# Altium schematic symbol library jlcpcb_2025_04_capacitors_extended_1206.schlib: 2503 symbols (part 4 of 14)
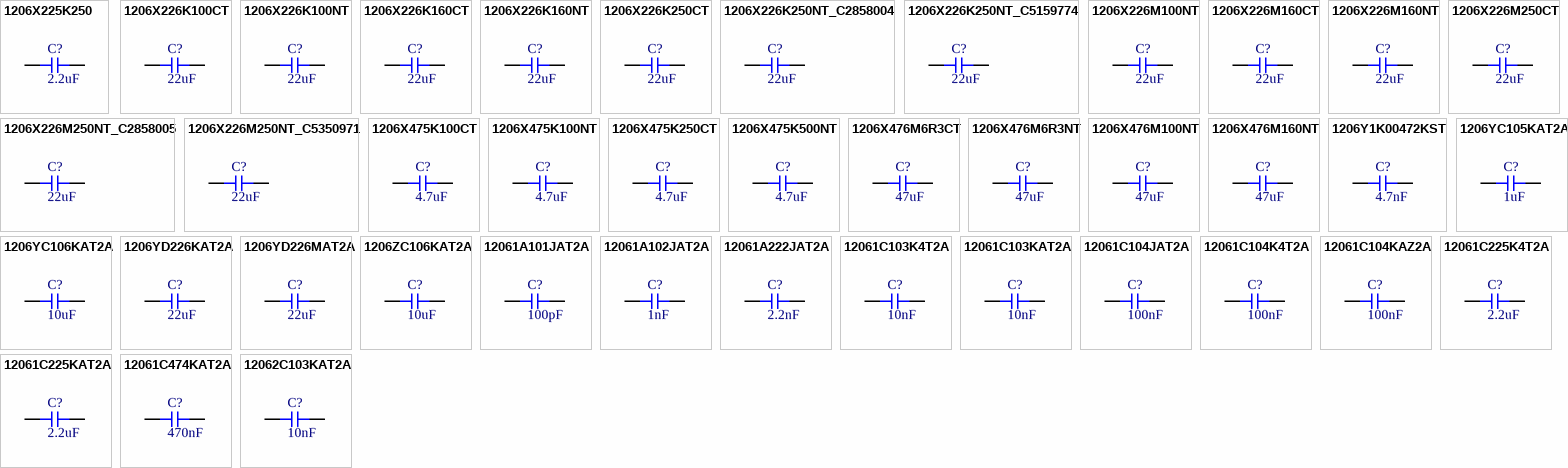
[diagram p65: symbols 1206X225K250 to 12062C103KAT2A]

## 1206X476M6R3CT
designator C?  Capacitance: 47uF  (hidden comment: *)
Capacitor, Ceramic (MLCC), 47uF, ±20%, 6.3V, X5R, ±20%, SMD 1206; Manufacturer: Walsin Tech Corp; Manufacturer Part Number: 1206X476M6R3CT; Package Size: 1206; JLCPCB Basic Part: No; JLCPCB Part Number: C396796; Supplier 1: LCSC; Category: Capacitors - MLCC; Supplier Part Number 1: C396796; Tolerance: ±20%; Voltage Rating: 6.3V; Temperature Coefficient: X5R; RoHS: Yes; ComponentLink1Description: Datasheet; ComponentLink1URL: https://wmsc.lcsc.com/wmsc/upload/file/pdf/v2/lcsc/2304140030_Walsin-Tech-Corp-1206X476M6R3CT_C396796.pdf; ComponentLink2Description: JLCPCB Part URL; ComponentLink2URL: https://jlcpcb.com/partdetail/C396796; ComponentLink3Description: LCSC Part URL; ComponentLink3URL: https://lcsc.com/product-detail/Multilayer-Ceramic-Capacitors-MLCC---SMD-SMT_Walsin-Tech-Corp-Walsin-Tech-Corp-1206X476M6R3CT_C396796.html
footprint CAP-1206 (1206 (3216M) Capacitor)
pins: 1, 2

## 1206X476M6R3NT
designator C?  Capacitance: 47uF  (hidden comment: *)
Capacitor, Ceramic (MLCC), 47uF, ±20%, 6.3V, X5R, ±20%, SMD 1206; Manufacturer: FH(Guangdong Fenghua Advanced Tech); Manufacturer Part Number: 1206X476M6R3NT; Package Size: 1206; JLCPCB Basic Part: No; JLCPCB Part Number: C105473; Supplier 1: LCSC; Category: Capacitors - MLCC; Supplier Part Number 1: C105473; Tolerance: ±20%; Voltage Rating: 6.3V; Temperature Coefficient: X5R; RoHS: Yes; ComponentLink1Description: Datasheet; ComponentLink1URL: https://wmsc.lcsc.com/wmsc/upload/file/pdf/v2/lcsc/2304140030_FH--Guangdong-Fenghua-Advanced-Tech-1206X476M6R3NT_C105473.pdf; ComponentLink2Description: JLCPCB Part URL; ComponentLink2URL: https://jlcpcb.com/partdetail/C105473; ComponentLink3Description: LCSC Part URL; ComponentLink3URL: https://lcsc.com/product-detail/Multilayer-Ceramic-Capacitors-MLCC---SMD-SMT_FH-Guangdong-Fenghua-Advanced-Tech-FH-Guangdong-Fenghua-Advanced-Tech-1206X476M6R3NT_C105473.html
footprint CAP-1206 (1206 (3216M) Capacitor)
pins: 1, 2

## 1206X476M100NT
designator C?  Capacitance: 47uF  (hidden comment: *)
Capacitor, Ceramic (MLCC), 47uF, ±20%, 10V, X5R, ±20%, SMD 1206; Manufacturer: FH(Guangdong Fenghua Advanced Tech); Manufacturer Part Number: 1206X476M100NT; Package Size: 1206; JLCPCB Basic Part: No; JLCPCB Part Number: C96381; Supplier 1: LCSC; Category: Capacitors - MLCC; Supplier Part Number 1: C96381; Tolerance: ±20%; Voltage Rating: 10V; Temperature Coefficient: X5R; RoHS: Yes; ComponentLink1Description: Datasheet; ComponentLink1URL: https://wmsc.lcsc.com/wmsc/upload/file/pdf/v2/lcsc/2304140030_FH--Guangdong-Fenghua-Advanced-Tech-1206X476M100NT_C96381.pdf; ComponentLink2Description: JLCPCB Part URL; ComponentLink2URL: https://jlcpcb.com/partdetail/C96381; ComponentLink3Description: LCSC Part URL; ComponentLink3URL: https://lcsc.com/product-detail/Multilayer-Ceramic-Capacitors-MLCC---SMD-SMT_FH-Guangdong-Fenghua-Advanced-Tech-FH-Guangdong-Fenghua-Advanced-Tech-1206X476M100NT_C96381.html
footprint CAP-1206 (1206 (3216M) Capacitor)
pins: 1, 2

## 1206X476M160NT
designator C?  Capacitance: 47uF  (hidden comment: *)
Capacitor, Ceramic (MLCC), 47uF, ±20%, 16V, X5R, ±20%, SMD 1206; Manufacturer: FH(Guangdong Fenghua Advanced Tech); Manufacturer Part Number: 1206X476M160NT; Package Size: 1206; JLCPCB Basic Part: No; JLCPCB Part Number: C172351; Supplier 1: LCSC; Category: Capacitors - MLCC; Supplier Part Number 1: C172351; Tolerance: ±20%; Voltage Rating: 16V; Temperature Coefficient: X5R; RoHS: Yes; ComponentLink1Description: Datasheet; ComponentLink1URL: https://wmsc.lcsc.com/wmsc/upload/file/pdf/v2/lcsc/2304140030_FH--Guangdong-Fenghua-Advanced-Tech-1206X476M160NT_C172351.pdf; ComponentLink2Description: JLCPCB Part URL; ComponentLink2URL: https://jlcpcb.com/partdetail/C172351; ComponentLink3Description: LCSC Part URL; ComponentLink3URL: https://lcsc.com/product-detail/Multilayer-Ceramic-Capacitors-MLCC---SMD-SMT_FH-Guangdong-Fenghua-Advanced-Tech-FH-Guangdong-Fenghua-Advanced-Tech-1206X476M160NT_C172351.html
footprint CAP-1206 (1206 (3216M) Capacitor)
pins: 1, 2

## 1206Y1K00472KST
designator C?  Capacitance: 4.7nF  (hidden comment: *)
Capacitor, Ceramic (MLCC), 4.7nF, ±10%, 1kV, X7R, ±10%, SMD 1206; Manufacturer: Knowles; Manufacturer Part Number: 1206Y1K00472KST; Package Size: 1206; JLCPCB Basic Part: No; JLCPCB Part Number: C2179288; Supplier 1: LCSC; Category: Capacitors - MLCC; Supplier Part Number 1: C2179288; Tolerance: ±10%; Voltage Rating: 1kV; Temperature Coefficient: X7R; RoHS: Yes; ComponentLink1Description: Datasheet; ComponentLink1URL: https://wmsc.lcsc.com/wmsc/upload/file/pdf/v2/lcsc/2304140030_Knowles-1206Y1K00472KST_C2179288.pdf; ComponentLink2Description: JLCPCB Part URL; ComponentLink2URL: https://jlcpcb.com/partdetail/C2179288; ComponentLink3Description: LCSC Part URL; ComponentLink3URL: https://lcsc.com/product-detail/Multilayer-Ceramic-Capacitors-MLCC---SMD-SMT_Knowles-Knowles-1206Y1K00472KST_C2179288.html
footprint CAP-1206 (1206 (3216M) Capacitor)
pins: 1, 2

## 1206YC105KAT2A
designator C?  Capacitance: 1uF  (hidden comment: *)
Capacitor, Ceramic (MLCC), 1uF, ±10%, 16V, X7R, ±10%, SMD 1206; Manufacturer: Kyocera AVX; Manufacturer Part Number: 1206YC105KAT2A; Package Size: 1206; JLCPCB Basic Part: No; JLCPCB Part Number: C2167861; Supplier 1: LCSC; Category: Capacitors - MLCC; Supplier Part Number 1: C2167861; Tolerance: ±10%; Voltage Rating: 16V; Temperature Coefficient: X7R; RoHS: Yes; ComponentLink1Description: Datasheet; ComponentLink1URL: https://wmsc.lcsc.com/wmsc/upload/file/pdf/v2/lcsc/2304140030_Kyocera-AVX-1206YC105KAT2A_C2167861.pdf; ComponentLink2Description: JLCPCB Part URL; ComponentLink2URL: https://jlcpcb.com/partdetail/C2167861; ComponentLink3Description: LCSC Part URL; ComponentLink3URL: https://lcsc.com/product-detail/Multilayer-Ceramic-Capacitors-MLCC---SMD-SMT_Kyocera-AVX-Kyocera-AVX-1206YC105KAT2A_C2167861.html
footprint CAP-1206 (1206 (3216M) Capacitor)
pins: 1, 2

## 1206YC106KAT2A
designator C?  Capacitance: 10uF  (hidden comment: *)
Capacitor, Ceramic (MLCC), 10uF, ±10%, 16V, X7R, ±10%, SMD 1206; Manufacturer: Kyocera AVX; Manufacturer Part Number: 1206YC106KAT2A; Package Size: 1206; JLCPCB Basic Part: No; JLCPCB Part Number: C2167802; Supplier 1: LCSC; Category: Capacitors - MLCC; Supplier Part Number 1: C2167802; Tolerance: ±10%; Voltage Rating: 16V; Temperature Coefficient: X7R; RoHS: Yes; ComponentLink1Description: Datasheet; ComponentLink1URL: https://wmsc.lcsc.com/wmsc/upload/file/pdf/v2/lcsc/2304140030_Kyocera-AVX-1206YC106KAT2A_C2167802.pdf; ComponentLink2Description: JLCPCB Part URL; ComponentLink2URL: https://jlcpcb.com/partdetail/C2167802; ComponentLink3Description: LCSC Part URL; ComponentLink3URL: https://lcsc.com/product-detail/Multilayer-Ceramic-Capacitors-MLCC---SMD-SMT_Kyocera-AVX-Kyocera-AVX-1206YC106KAT2A_C2167802.html
footprint CAP-1206 (1206 (3216M) Capacitor)
pins: 1, 2

## 1206YD226KAT2A
designator C?  Capacitance: 22uF  (hidden comment: *)
Capacitor, Ceramic (MLCC), 22uF, ±10%, 16V, X5R, ±10%, SMD 1206; Manufacturer: AVX; Manufacturer Part Number: 1206YD226KAT2A; Package Size: 1206; JLCPCB Basic Part: No; JLCPCB Part Number: C597546; Supplier 1: LCSC; Category: Capacitors - MLCC; Supplier Part Number 1: C597546; Tolerance: ±10%; Voltage Rating: 16V; Temperature Coefficient: X5R; RoHS: Yes; ComponentLink1Description: Datasheet; ComponentLink1URL: https://wmsc.lcsc.com/wmsc/upload/file/pdf/v2/lcsc/2304140030_Kyocera-AVX-1206YD226KAT2A_C597546.pdf; ComponentLink2Description: JLCPCB Part URL; ComponentLink2URL: https://jlcpcb.com/partdetail/C597546; ComponentLink3Description: LCSC Part URL; ComponentLink3URL: https://lcsc.com/product-detail/Multilayer-Ceramic-Capacitors-MLCC---SMD-SMT_Kyocera-AVX-Kyocera-AVX-1206YD226KAT2A_C597546.html
footprint CAP-1206 (1206 (3216M) Capacitor)
pins: 1, 2

## 1206YD226MAT2A
designator C?  Capacitance: 22uF  (hidden comment: *)
Capacitor, Ceramic (MLCC), 22uF, ±20%, 16V, X5R, ±20%, SMD 1206; Manufacturer: AVX; Manufacturer Part Number: 1206YD226MAT2A; Package Size: 1206; JLCPCB Basic Part: No; JLCPCB Part Number: C597547; Supplier 1: LCSC; Category: Capacitors - MLCC; Supplier Part Number 1: C597547; Tolerance: ±20%; Voltage Rating: 16V; Temperature Coefficient: X5R; RoHS: Yes; ComponentLink1Description: Datasheet; ComponentLink1URL: https://wmsc.lcsc.com/wmsc/upload/file/pdf/v2/lcsc/2304140030_Kyocera-AVX-1206YD226MAT2A_C597547.pdf; ComponentLink2Description: JLCPCB Part URL; ComponentLink2URL: https://jlcpcb.com/partdetail/C597547; ComponentLink3Description: LCSC Part URL; ComponentLink3URL: https://lcsc.com/product-detail/Multilayer-Ceramic-Capacitors-MLCC---SMD-SMT_Kyocera-AVX-Kyocera-AVX-1206YD226MAT2A_C597547.html
footprint CAP-1206 (1206 (3216M) Capacitor)
pins: 1, 2

## 1206ZC106KAT2A
designator C?  Capacitance: 10uF  (hidden comment: *)
Capacitor, Ceramic (MLCC), 10uF, ±10%, 10V, X7R, ±10%, SMD 1206; Manufacturer: AVX; Manufacturer Part Number: 1206ZC106KAT2A; Package Size: 1206; JLCPCB Basic Part: No; JLCPCB Part Number: C597550; Supplier 1: LCSC; Category: Capacitors - MLCC; Supplier Part Number 1: C597550; Tolerance: ±10%; Voltage Rating: 10V; Temperature Coefficient: X7R; RoHS: Yes; ComponentLink1Description: Datasheet; ComponentLink1URL: https://wmsc.lcsc.com/wmsc/upload/file/pdf/v2/lcsc/2304140030_Kyocera-AVX-1206ZC106KAT2A_C597550.pdf; ComponentLink2Description: JLCPCB Part URL; ComponentLink2URL: https://jlcpcb.com/partdetail/C597550; ComponentLink3Description: LCSC Part URL; ComponentLink3URL: https://lcsc.com/product-detail/Multilayer-Ceramic-Capacitors-MLCC---SMD-SMT_Kyocera-AVX-Kyocera-AVX-1206ZC106KAT2A_C597550.html
footprint CAP-1206 (1206 (3216M) Capacitor)
pins: 1, 2

## 12061A101JAT2A
designator C?  Capacitance: 100pF  (hidden comment: *)
Capacitor, Ceramic (MLCC), 100pF, ±5%, 100V, C0G, ±5%, SMD 1206; Manufacturer: AVX; Manufacturer Part Number: 12061A101JAT2A; Package Size: 1206; JLCPCB Basic Part: No; JLCPCB Part Number: C597446; Supplier 1: LCSC; Category: Capacitors - MLCC; Supplier Part Number 1: C597446; Tolerance: ±5%; Voltage Rating: 100V; Temperature Coefficient: C0G; RoHS: Yes; ComponentLink1Description: Datasheet; ComponentLink1URL: https://wmsc.lcsc.com/wmsc/upload/file/pdf/v2/lcsc/2304140030_Kyocera-AVX-12061A101JAT2A_C597446.pdf; ComponentLink2Description: JLCPCB Part URL; ComponentLink2URL: https://jlcpcb.com/partdetail/C597446; ComponentLink3Description: LCSC Part URL; ComponentLink3URL: https://lcsc.com/product-detail/Multilayer-Ceramic-Capacitors-MLCC---SMD-SMT_Kyocera-AVX-Kyocera-AVX-12061A101JAT2A_C597446.html
footprint CAP-1206 (1206 (3216M) Capacitor)
pins: 1, 2

## 12061A102JAT2A
designator C?  Capacitance: 1nF  (hidden comment: *)
Capacitor, Ceramic (MLCC), 1nF, ±5%, 100V, C0G, ±5%, SMD 1206; Manufacturer: AVX; Manufacturer Part Number: 12061A102JAT2A; Package Size: 1206; JLCPCB Basic Part: No; JLCPCB Part Number: C597448; Supplier 1: LCSC; Category: Capacitors - MLCC; Supplier Part Number 1: C597448; Tolerance: ±5%; Voltage Rating: 100V; Temperature Coefficient: C0G; RoHS: Yes; ComponentLink1Description: Datasheet; ComponentLink1URL: https://wmsc.lcsc.com/wmsc/upload/file/pdf/v2/lcsc/2304140030_Kyocera-AVX-12061A102JAT2A_C597448.pdf; ComponentLink2Description: JLCPCB Part URL; ComponentLink2URL: https://jlcpcb.com/partdetail/C597448; ComponentLink3Description: LCSC Part URL; ComponentLink3URL: https://lcsc.com/product-detail/Multilayer-Ceramic-Capacitors-MLCC---SMD-SMT_Kyocera-AVX-Kyocera-AVX-12061A102JAT2A_C597448.html
footprint CAP-1206 (1206 (3216M) Capacitor)
pins: 1, 2

## 12061A222JAT2A
designator C?  Capacitance: 2.2nF  (hidden comment: *)
Capacitor, Ceramic (MLCC), 2.2nF, ±5%, 100V, C0G, ±5%, SMD 1206; Manufacturer: AVX; Manufacturer Part Number: 12061A222JAT2A; Package Size: 1206; JLCPCB Basic Part: No; JLCPCB Part Number: C597450; Supplier 1: LCSC; Category: Capacitors - MLCC; Supplier Part Number 1: C597450; Tolerance: ±5%; Voltage Rating: 100V; Temperature Coefficient: C0G; RoHS: Yes; ComponentLink1Description: Datasheet; ComponentLink1URL: https://wmsc.lcsc.com/wmsc/upload/file/pdf/v2/lcsc/2304140030_Kyocera-AVX-12061A222JAT2A_C597450.pdf; ComponentLink2Description: JLCPCB Part URL; ComponentLink2URL: https://jlcpcb.com/partdetail/C597450; ComponentLink3Description: LCSC Part URL; ComponentLink3URL: https://lcsc.com/product-detail/Multilayer-Ceramic-Capacitors-MLCC---SMD-SMT_Kyocera-AVX-Kyocera-AVX-12061A222JAT2A_C597450.html
footprint CAP-1206 (1206 (3216M) Capacitor)
pins: 1, 2

## 12061C103K4T2A
designator C?  Capacitance: 10nF  (hidden comment: *)
Capacitor, Ceramic (MLCC), 10nF, ±10%, 100V, X7R, ±10%, SMD 1206; Manufacturer: AVX; Manufacturer Part Number: 12061C103K4T2A; Package Size: 1206; JLCPCB Basic Part: No; JLCPCB Part Number: C779992; Supplier 1: LCSC; Category: Capacitors - MLCC; Supplier Part Number 1: C779992; Tolerance: ±10%; Voltage Rating: 100V; Temperature Coefficient: X7R; RoHS: Yes; ComponentLink1Description: Datasheet; ComponentLink1URL: https://wmsc.lcsc.com/wmsc/upload/file/pdf/v2/lcsc/2304140030_Kyocera-AVX-12061C103K4T2A_C779992.pdf; ComponentLink2Description: JLCPCB Part URL; ComponentLink2URL: https://jlcpcb.com/partdetail/C779992; ComponentLink3Description: LCSC Part URL; ComponentLink3URL: https://lcsc.com/product-detail/Multilayer-Ceramic-Capacitors-MLCC---SMD-SMT_Kyocera-AVX-Kyocera-AVX-12061C103K4T2A_C779992.html
footprint CAP-1206 (1206 (3216M) Capacitor)
pins: 1, 2

## 12061C103KAT2A
designator C?  Capacitance: 10nF  (hidden comment: *)
Capacitor, Ceramic (MLCC), 10nF, ±10%, 100V, X7R, ±10%, SMD 1206; Manufacturer: AVX; Manufacturer Part Number: 12061C103KAT2A; Package Size: 1206; JLCPCB Basic Part: No; JLCPCB Part Number: C597454; Supplier 1: LCSC; Category: Capacitors - MLCC; Supplier Part Number 1: C597454; Tolerance: ±10%; Voltage Rating: 100V; Temperature Coefficient: X7R; RoHS: Yes; ComponentLink1Description: Datasheet; ComponentLink1URL: https://wmsc.lcsc.com/wmsc/upload/file/pdf/v2/lcsc/2304140030_Kyocera-AVX-12061C103KAT2A_C597454.pdf; ComponentLink2Description: JLCPCB Part URL; ComponentLink2URL: https://jlcpcb.com/partdetail/C597454; ComponentLink3Description: LCSC Part URL; ComponentLink3URL: https://lcsc.com/product-detail/Multilayer-Ceramic-Capacitors-MLCC---SMD-SMT_Kyocera-AVX-Kyocera-AVX-12061C103KAT2A_C597454.html
footprint CAP-1206 (1206 (3216M) Capacitor)
pins: 1, 2

## 12061C104JAT2A
designator C?  Capacitance: 100nF  (hidden comment: *)
Capacitor, Ceramic (MLCC), 100nF, ±5%, 100V, X7R, ±5%, SMD 1206; Manufacturer: AVX; Manufacturer Part Number: 12061C104JAT2A; Package Size: 1206; JLCPCB Basic Part: No; JLCPCB Part Number: C597455; Supplier 1: LCSC; Category: Capacitors - MLCC; Supplier Part Number 1: C597455; Tolerance: ±5%; Voltage Rating: 100V; Temperature Coefficient: X7R; RoHS: Yes; ComponentLink1Description: Datasheet; ComponentLink1URL: https://wmsc.lcsc.com/wmsc/upload/file/pdf/v2/lcsc/2304140030_Kyocera-AVX-12061C104JAT2A_C597455.pdf; ComponentLink2Description: JLCPCB Part URL; ComponentLink2URL: https://jlcpcb.com/partdetail/C597455; ComponentLink3Description: LCSC Part URL; ComponentLink3URL: https://lcsc.com/product-detail/Multilayer-Ceramic-Capacitors-MLCC---SMD-SMT_Kyocera-AVX-Kyocera-AVX-12061C104JAT2A_C597455.html
footprint CAP-1206 (1206 (3216M) Capacitor)
pins: 1, 2

## 12061C104K4T2A
designator C?  Capacitance: 100nF  (hidden comment: *)
Capacitor, Ceramic (MLCC), 100nF, ±10%, 100V, X7R, ±10%, SMD 1206; Manufacturer: Kyocera AVX; Manufacturer Part Number: 12061C104K4T2A; Package Size: 1206; JLCPCB Basic Part: No; JLCPCB Part Number: C779988; Supplier 1: LCSC; Category: Capacitors - MLCC; Supplier Part Number 1: C779988; Tolerance: ±10%; Voltage Rating: 100V; Temperature Coefficient: X7R; RoHS: Yes; ComponentLink1Description: Datasheet; ComponentLink1URL: https://wmsc.lcsc.com/wmsc/upload/file/pdf/v2/lcsc/2304140030_Kyocera-AVX-12061C104K4T2A_C779988.pdf; ComponentLink2Description: JLCPCB Part URL; ComponentLink2URL: https://jlcpcb.com/partdetail/C779988; ComponentLink3Description: LCSC Part URL; ComponentLink3URL: https://lcsc.com/product-detail/Multilayer-Ceramic-Capacitors-MLCC---SMD-SMT_Kyocera-AVX-Kyocera-AVX-12061C104K4T2A_C779988.html
footprint CAP-1206 (1206 (3216M) Capacitor)
pins: 1, 2

## 12061C104KAZ2A
designator C?  Capacitance: 100nF  (hidden comment: *)
Capacitor, Ceramic (MLCC), 100nF, ±10%, 100V, X7R, ±10%, SMD 1206; Manufacturer: AVX; Manufacturer Part Number: 12061C104KAZ2A; Package Size: 1206; JLCPCB Basic Part: No; JLCPCB Part Number: C597456; Supplier 1: LCSC; Category: Capacitors - MLCC; Supplier Part Number 1: C597456; Tolerance: ±10%; Voltage Rating: 100V; Temperature Coefficient: X7R; RoHS: Yes; ComponentLink1Description: Datasheet; ComponentLink1URL: https://wmsc.lcsc.com/wmsc/upload/file/pdf/v2/lcsc/2304140030_Kyocera-AVX-12061C104KAZ2A_C597456.pdf; ComponentLink2Description: JLCPCB Part URL; ComponentLink2URL: https://jlcpcb.com/partdetail/C597456; ComponentLink3Description: LCSC Part URL; ComponentLink3URL: https://lcsc.com/product-detail/Multilayer-Ceramic-Capacitors-MLCC---SMD-SMT_Kyocera-AVX-Kyocera-AVX-12061C104KAZ2A_C597456.html
footprint CAP-1206 (1206 (3216M) Capacitor)
pins: 1, 2

## 12061C225K4T2A
designator C?  Capacitance: 2.2uF  (hidden comment: *)
Capacitor, Ceramic (MLCC), 2.2uF, ±10%, 100V, X7R, ±10%, SMD 1206; Manufacturer: AVX; Manufacturer Part Number: 12061C225K4T2A; Package Size: 1206; JLCPCB Basic Part: No; JLCPCB Part Number: C779998; Supplier 1: LCSC; Category: Capacitors - MLCC; Supplier Part Number 1: C779998; Tolerance: ±10%; Voltage Rating: 100V; Temperature Coefficient: X7R; RoHS: Yes; ComponentLink1Description: Datasheet; ComponentLink1URL: https://wmsc.lcsc.com/wmsc/upload/file/pdf/v2/lcsc/2304140030_Kyocera-AVX-12061C225K4T2A_C779998.pdf; ComponentLink2Description: JLCPCB Part URL; ComponentLink2URL: https://jlcpcb.com/partdetail/C779998; ComponentLink3Description: LCSC Part URL; ComponentLink3URL: https://lcsc.com/product-detail/Multilayer-Ceramic-Capacitors-MLCC---SMD-SMT_Kyocera-AVX-Kyocera-AVX-12061C225K4T2A_C779998.html
footprint CAP-1206 (1206 (3216M) Capacitor)
pins: 1, 2

## 12061C225KAT2A
designator C?  Capacitance: 2.2uF  (hidden comment: *)
Capacitor, Ceramic (MLCC), 2.2uF, ±10%, 100V, X7R, ±10%, SMD 1206; Manufacturer: Kyocera AVX; Manufacturer Part Number: 12061C225KAT2A; Package Size: 1206; JLCPCB Basic Part: No; JLCPCB Part Number: C2182280; Supplier 1: LCSC; Category: Capacitors - MLCC; Supplier Part Number 1: C2182280; Tolerance: ±10%; Voltage Rating: 100V; Temperature Coefficient: X7R; RoHS: Yes; ComponentLink1Description: Datasheet; ComponentLink1URL: https://wmsc.lcsc.com/wmsc/upload/file/pdf/v2/lcsc/2304140030_Kyocera-AVX-12061C225KAT2A_C2182280.pdf; ComponentLink2Description: JLCPCB Part URL; ComponentLink2URL: https://jlcpcb.com/partdetail/C2182280; ComponentLink3Description: LCSC Part URL; ComponentLink3URL: https://lcsc.com/product-detail/Multilayer-Ceramic-Capacitors-MLCC---SMD-SMT_Kyocera-AVX-Kyocera-AVX-12061C225KAT2A_C2182280.html
footprint CAP-1206 (1206 (3216M) Capacitor)
pins: 1, 2

## 12061C474KAT2A
designator C?  Capacitance: 470nF  (hidden comment: *)
Capacitor, Ceramic (MLCC), 470nF, ±10%, 100V, X7R, ±10%, SMD 1206; Manufacturer: AVX; Manufacturer Part Number: 12061C474KAT2A; Package Size: 1206; JLCPCB Basic Part: No; JLCPCB Part Number: C597470; Supplier 1: LCSC; Category: Capacitors - MLCC; Supplier Part Number 1: C597470; Tolerance: ±10%; Voltage Rating: 100V; Temperature Coefficient: X7R; RoHS: Yes; ComponentLink1Description: Datasheet; ComponentLink1URL: https://wmsc.lcsc.com/wmsc/upload/file/pdf/v2/lcsc/2304140030_Kyocera-AVX-12061C474KAT2A_C597470.pdf; ComponentLink2Description: JLCPCB Part URL; ComponentLink2URL: https://jlcpcb.com/partdetail/C597470; ComponentLink3Description: LCSC Part URL; ComponentLink3URL: https://lcsc.com/product-detail/Multilayer-Ceramic-Capacitors-MLCC---SMD-SMT_Kyocera-AVX-Kyocera-AVX-12061C474KAT2A_C597470.html
footprint CAP-1206 (1206 (3216M) Capacitor)
pins: 1, 2

## 12062C103KAT2A
designator C?  Capacitance: 10nF  (hidden comment: *)
Capacitor, Ceramic (MLCC), 10nF, ±10%, 200V, X7R, ±10%, SMD 1206; Manufacturer: AVX; Manufacturer Part Number: 12062C103KAT2A; Package Size: 1206; JLCPCB Basic Part: No; JLCPCB Part Number: C597478; Supplier 1: LCSC; Category: Capacitors - MLCC; Supplier Part Number 1: C597478; Tolerance: ±10%; Voltage Rating: 200V; Temperature Coefficient: X7R; RoHS: Yes; ComponentLink1Description: Datasheet; ComponentLink1URL: https://wmsc.lcsc.com/wmsc/upload/file/pdf/v2/lcsc/2304140030_Kyocera-AVX-12062C103KAT2A_C597478.pdf; ComponentLink2Description: JLCPCB Part URL; ComponentLink2URL: https://jlcpcb.com/partdetail/C597478; ComponentLink3Description: LCSC Part URL; ComponentLink3URL: https://lcsc.com/product-detail/Multilayer-Ceramic-Capacitors-MLCC---SMD-SMT_Kyocera-AVX-Kyocera-AVX-12062C103KAT2A_C597478.html
footprint CAP-1206 (1206 (3216M) Capacitor)
pins: 1, 2

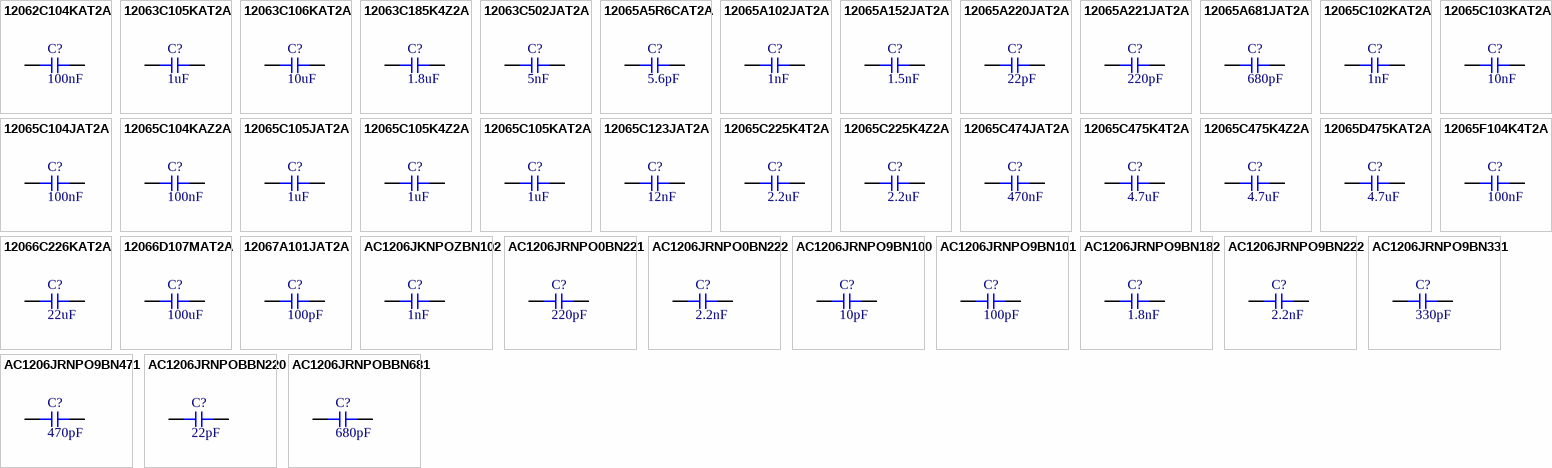
[diagram p14: symbols 12062C104KAT2A to AC1206JRNPOBBN681]

## 12062C104KAT2A
designator C?  Capacitance: 100nF  (hidden comment: *)
Capacitor, Ceramic (MLCC), 100nF, ±10%, 200V, X7R, ±10%, SMD 1206; Manufacturer: Kyocera AVX; Manufacturer Part Number: 12062C104KAT2A; Package Size: 1206; JLCPCB Basic Part: No; JLCPCB Part Number: C2171284; Supplier 1: LCSC; Category: Capacitors - MLCC; Supplier Part Number 1: C2171284; Tolerance: ±10%; Voltage Rating: 200V; Temperature Coefficient: X7R; RoHS: Yes; ComponentLink1Description: Datasheet; ComponentLink1URL: https://wmsc.lcsc.com/wmsc/upload/file/pdf/v2/lcsc/2304140030_Kyocera-AVX-12062C104KAT2A_C2171284.pdf; ComponentLink2Description: JLCPCB Part URL; ComponentLink2URL: https://jlcpcb.com/partdetail/C2171284; ComponentLink3Description: LCSC Part URL; ComponentLink3URL: https://lcsc.com/product-detail/Multilayer-Ceramic-Capacitors-MLCC---SMD-SMT_Kyocera-AVX-Kyocera-AVX-12062C104KAT2A_C2171284.html
footprint CAP-1206 (1206 (3216M) Capacitor)
pins: 1, 2

## 12063C105KAT2A
designator C?  Capacitance: 1uF  (hidden comment: *)
Capacitor, Ceramic (MLCC), 1uF, ±10%, 25V, X7R, ±10%, SMD 1206; Manufacturer: Kyocera AVX; Manufacturer Part Number: 12063C105KAT2A; Package Size: 1206; JLCPCB Basic Part: No; JLCPCB Part Number: C2167336; Supplier 1: LCSC; Category: Capacitors - MLCC; Supplier Part Number 1: C2167336; Tolerance: ±10%; Voltage Rating: 25V; Temperature Coefficient: X7R; RoHS: Yes; ComponentLink1Description: Datasheet; ComponentLink1URL: https://wmsc.lcsc.com/wmsc/upload/file/pdf/v2/lcsc/2304140030_Kyocera-AVX-12063C105KAT2A_C2167336.pdf; ComponentLink2Description: JLCPCB Part URL; ComponentLink2URL: https://jlcpcb.com/partdetail/C2167336; ComponentLink3Description: LCSC Part URL; ComponentLink3URL: https://lcsc.com/product-detail/Multilayer-Ceramic-Capacitors-MLCC---SMD-SMT_Kyocera-AVX-Kyocera-AVX-12063C105KAT2A_C2167336.html
footprint CAP-1206 (1206 (3216M) Capacitor)
pins: 1, 2

## 12063C106KAT2A
designator C?  Capacitance: 10uF  (hidden comment: *)
Capacitor, Ceramic (MLCC), 10uF, ±10%, 25V, X7R, ±10%, SMD 1206; Manufacturer: Kyocera AVX; Manufacturer Part Number: 12063C106KAT2A; Package Size: 1206; JLCPCB Basic Part: No; JLCPCB Part Number: C2167988; Supplier 1: LCSC; Category: Capacitors - MLCC; Supplier Part Number 1: C2167988; Tolerance: ±10%; Voltage Rating: 25V; Temperature Coefficient: X7R; RoHS: Yes; ComponentLink1Description: Datasheet; ComponentLink1URL: https://wmsc.lcsc.com/wmsc/upload/file/pdf/v2/lcsc/2304140030_Kyocera-AVX-12063C106KAT2A_C2167988.pdf; ComponentLink2Description: JLCPCB Part URL; ComponentLink2URL: https://jlcpcb.com/partdetail/C2167988; ComponentLink3Description: LCSC Part URL; ComponentLink3URL: https://lcsc.com/product-detail/Multilayer-Ceramic-Capacitors-MLCC---SMD-SMT_Kyocera-AVX-Kyocera-AVX-12063C106KAT2A_C2167988.html
footprint CAP-1206 (1206 (3216M) Capacitor)
pins: 1, 2

## 12063C185K4Z2A
designator C?  Capacitance: 1.8uF  (hidden comment: *)
Capacitor, Ceramic (MLCC), 1.8uF, ±10%, 25V, X7R, ±10%, SMD 1206; Manufacturer: Kyocera AVX; Manufacturer Part Number: 12063C185K4Z2A; Package Size: 1206; JLCPCB Basic Part: No; JLCPCB Part Number: C2182193; Supplier 1: LCSC; Category: Capacitors - MLCC; Supplier Part Number 1: C2182193; Tolerance: ±10%; Voltage Rating: 25V; Temperature Coefficient: X7R; RoHS: Yes; ComponentLink1Description: Datasheet; ComponentLink1URL: https://wmsc.lcsc.com/wmsc/upload/file/pdf/v2/lcsc/2304140030_Kyocera-AVX-12063C185K4Z2A_C2182193.pdf; ComponentLink2Description: JLCPCB Part URL; ComponentLink2URL: https://jlcpcb.com/partdetail/C2182193; ComponentLink3Description: LCSC Part URL; ComponentLink3URL: https://lcsc.com/product-detail/Multilayer-Ceramic-Capacitors-MLCC---SMD-SMT_Kyocera-AVX-Kyocera-AVX-12063C185K4Z2A_C2182193.html
footprint CAP-1206 (1206 (3216M) Capacitor)
pins: 1, 2

## 12063C502JAT2A
designator C?  Capacitance: 5nF  (hidden comment: *)
Capacitor, Ceramic (MLCC), 5nF, ±5%, 25V, X7R, ±5%, SMD 1206; Manufacturer: Kyocera AVX; Manufacturer Part Number: 12063C502JAT2A; Package Size: 1206; JLCPCB Basic Part: No; JLCPCB Part Number: C2224981; Supplier 1: LCSC; Category: Capacitors - MLCC; Supplier Part Number 1: C2224981; Tolerance: ±5%; Voltage Rating: 25V; Temperature Coefficient: X7R; RoHS: Yes; ComponentLink1Description: Datasheet; ComponentLink1URL: https://wmsc.lcsc.com/wmsc/upload/file/pdf/v2/lcsc/2304140030_Kyocera-AVX-12063C502JAT2A_C2224981.pdf; ComponentLink2Description: JLCPCB Part URL; ComponentLink2URL: https://jlcpcb.com/partdetail/C2224981; ComponentLink3Description: LCSC Part URL; ComponentLink3URL: https://lcsc.com/product-detail/Multilayer-Ceramic-Capacitors-MLCC---SMD-SMT_Kyocera-AVX-Kyocera-AVX-12063C502JAT2A_C2224981.html
footprint CAP-1206 (1206 (3216M) Capacitor)
pins: 1, 2

## 12065A5R6CAT2A
designator C?  Capacitance: 5.6pF  (hidden comment: *)
Capacitor, Ceramic (MLCC), 5.6pF, 50V, SMD 1206; Manufacturer: Kyocera AVX; Manufacturer Part Number: 12065A5R6CAT2A; Package Size: 1206; JLCPCB Basic Part: No; JLCPCB Part Number: C2182869; Supplier 1: LCSC; Category: Capacitors - MLCC; Supplier Part Number 1: C2182869; Voltage Rating: 50V; RoHS: Yes; ComponentLink1Description: Datasheet; ComponentLink1URL: https://wmsc.lcsc.com/wmsc/upload/file/pdf/v2/lcsc/2304140030_Kyocera-AVX-12065A5R6CAT2A_C2182869.pdf; ComponentLink2Description: JLCPCB Part URL; ComponentLink2URL: https://jlcpcb.com/partdetail/C2182869; ComponentLink3Description: LCSC Part URL; ComponentLink3URL: https://lcsc.com/product-detail/Multilayer-Ceramic-Capacitors-MLCC---SMD-SMT_Kyocera-AVX-Kyocera-AVX-12065A5R6CAT2A_C2182869.html
footprint CAP-1206 (1206 (3216M) Capacitor)
pins: 1, 2

## 12065A102JAT2A
designator C?  Capacitance: 1nF  (hidden comment: *)
Capacitor, Ceramic (MLCC), 1nF, ±5%, 50V, C0G, ±5%, SMD 1206; Manufacturer: AVX; Manufacturer Part Number: 12065A102JAT2A; Package Size: 1206; JLCPCB Basic Part: No; JLCPCB Part Number: C597493; Supplier 1: LCSC; Category: Capacitors - MLCC; Supplier Part Number 1: C597493; Tolerance: ±5%; Voltage Rating: 50V; Temperature Coefficient: C0G; RoHS: Yes; ComponentLink1Description: Datasheet; ComponentLink1URL: https://wmsc.lcsc.com/wmsc/upload/file/pdf/v2/lcsc/2304140030_Kyocera-AVX-12065A102JAT2A_C597493.pdf; ComponentLink2Description: JLCPCB Part URL; ComponentLink2URL: https://jlcpcb.com/partdetail/C597493; ComponentLink3Description: LCSC Part URL; ComponentLink3URL: https://lcsc.com/product-detail/Multilayer-Ceramic-Capacitors-MLCC---SMD-SMT_Kyocera-AVX-Kyocera-AVX-12065A102JAT2A_C597493.html
footprint CAP-1206 (1206 (3216M) Capacitor)
pins: 1, 2

## 12065A152JAT2A
designator C?  Capacitance: 1.5nF  (hidden comment: *)
Capacitor, Ceramic (MLCC), 1.5nF, ±5%, 50V, C0G, ±5%, SMD 1206; Manufacturer: Kyocera AVX; Manufacturer Part Number: 12065A152JAT2A; Package Size: 1206; JLCPCB Basic Part: No; JLCPCB Part Number: C2172394; Supplier 1: LCSC; Category: Capacitors - MLCC; Supplier Part Number 1: C2172394; Tolerance: ±5%; Voltage Rating: 50V; Temperature Coefficient: C0G; RoHS: Yes; ComponentLink1Description: Datasheet; ComponentLink1URL: https://wmsc.lcsc.com/wmsc/upload/file/pdf/v2/lcsc/2304140030_Kyocera-AVX-12065A152JAT2A_C2172394.pdf; ComponentLink2Description: JLCPCB Part URL; ComponentLink2URL: https://jlcpcb.com/partdetail/C2172394; ComponentLink3Description: LCSC Part URL; ComponentLink3URL: https://lcsc.com/product-detail/Multilayer-Ceramic-Capacitors-MLCC---SMD-SMT_Kyocera-AVX-Kyocera-AVX-12065A152JAT2A_C2172394.html
footprint CAP-1206 (1206 (3216M) Capacitor)
pins: 1, 2

## 12065A220JAT2A
designator C?  Capacitance: 22pF  (hidden comment: *)
Capacitor, Ceramic (MLCC), 22pF, ±5%, 50V, C0G, ±5%, SMD 1206; Manufacturer: AVX; Manufacturer Part Number: 12065A220JAT2A; Package Size: 1206; JLCPCB Basic Part: No; JLCPCB Part Number: C597494; Supplier 1: LCSC; Category: Capacitors - MLCC; Supplier Part Number 1: C597494; Tolerance: ±5%; Voltage Rating: 50V; Temperature Coefficient: C0G; RoHS: Yes; ComponentLink1Description: Datasheet; ComponentLink1URL: https://wmsc.lcsc.com/wmsc/upload/file/pdf/v2/lcsc/2304140030_Kyocera-AVX-12065A220JAT2A_C597494.pdf; ComponentLink2Description: JLCPCB Part URL; ComponentLink2URL: https://jlcpcb.com/partdetail/C597494; ComponentLink3Description: LCSC Part URL; ComponentLink3URL: https://lcsc.com/product-detail/Multilayer-Ceramic-Capacitors-MLCC---SMD-SMT_Kyocera-AVX-Kyocera-AVX-12065A220JAT2A_C597494.html
footprint CAP-1206 (1206 (3216M) Capacitor)
pins: 1, 2

## 12065A221JAT2A
designator C?  Capacitance: 220pF  (hidden comment: *)
Capacitor, Ceramic (MLCC), 220pF, ±5%, 50V, C0G, ±5%, SMD 1206; Manufacturer: AVX; Manufacturer Part Number: 12065A221JAT2A; Package Size: 1206; JLCPCB Basic Part: No; JLCPCB Part Number: C597495; Supplier 1: LCSC; Category: Capacitors - MLCC; Supplier Part Number 1: C597495; Tolerance: ±5%; Voltage Rating: 50V; Temperature Coefficient: C0G; RoHS: Yes; ComponentLink1Description: Datasheet; ComponentLink1URL: https://wmsc.lcsc.com/wmsc/upload/file/pdf/v2/lcsc/2304140030_Kyocera-AVX-12065A221JAT2A_C597495.pdf; ComponentLink2Description: JLCPCB Part URL; ComponentLink2URL: https://jlcpcb.com/partdetail/C597495; ComponentLink3Description: LCSC Part URL; ComponentLink3URL: https://lcsc.com/product-detail/Multilayer-Ceramic-Capacitors-MLCC---SMD-SMT_Kyocera-AVX-Kyocera-AVX-12065A221JAT2A_C597495.html
footprint CAP-1206 (1206 (3216M) Capacitor)
pins: 1, 2

## 12065A681JAT2A
designator C?  Capacitance: 680pF  (hidden comment: *)
Capacitor, Ceramic (MLCC), 680pF, ±5%, 50V, C0G, ±5%, SMD 1206; Manufacturer: Kyocera AVX; Manufacturer Part Number: 12065A681JAT2A; Package Size: 1206; JLCPCB Basic Part: No; JLCPCB Part Number: C1845533; Supplier 1: LCSC; Category: Capacitors - MLCC; Supplier Part Number 1: C1845533; Tolerance: ±5%; Voltage Rating: 50V; Temperature Coefficient: C0G; RoHS: Yes; ComponentLink1Description: Datasheet; ComponentLink2Description: JLCPCB Part URL; ComponentLink2URL: https://jlcpcb.com/partdetail/C1845533; ComponentLink3Description: LCSC Part URL; ComponentLink3URL: https://lcsc.com/product-detail/Multilayer-Ceramic-Capacitors-MLCC---SMD-SMT_Kyocera-AVX-Kyocera-AVX-12065A681JAT2A_C1845533.html
footprint CAP-1206 (1206 (3216M) Capacitor)
pins: 1, 2

## 12065C102KAT2A
designator C?  Capacitance: 1nF  (hidden comment: *)
Capacitor, Ceramic (MLCC), 1nF, ±10%, 50V, X7R, ±10%, SMD 1206; Manufacturer: AVX; Manufacturer Part Number: 12065C102KAT2A; Package Size: 1206; JLCPCB Basic Part: No; JLCPCB Part Number: C597498; Supplier 1: LCSC; Category: Capacitors - MLCC; Supplier Part Number 1: C597498; Tolerance: ±10%; Voltage Rating: 50V; Temperature Coefficient: X7R; RoHS: Yes; ComponentLink1Description: Datasheet; ComponentLink1URL: https://wmsc.lcsc.com/wmsc/upload/file/pdf/v2/lcsc/2304140030_Kyocera-AVX-12065C102KAT2A_C597498.pdf; ComponentLink2Description: JLCPCB Part URL; ComponentLink2URL: https://jlcpcb.com/partdetail/C597498; ComponentLink3Description: LCSC Part URL; ComponentLink3URL: https://lcsc.com/product-detail/Multilayer-Ceramic-Capacitors-MLCC---SMD-SMT_Kyocera-AVX-Kyocera-AVX-12065C102KAT2A_C597498.html
footprint CAP-1206 (1206 (3216M) Capacitor)
pins: 1, 2

## 12065C103KAT2A
designator C?  Capacitance: 10nF  (hidden comment: *)
Capacitor, Ceramic (MLCC), 10nF, ±10%, 50V, X7R, ±10%, SMD 1206; Manufacturer: Kyocera AVX; Manufacturer Part Number: 12065C103KAT2A; Package Size: 1206; JLCPCB Basic Part: No; JLCPCB Part Number: C2167162; Supplier 1: LCSC; Category: Capacitors - MLCC; Supplier Part Number 1: C2167162; Tolerance: ±10%; Voltage Rating: 50V; Temperature Coefficient: X7R; RoHS: Yes; ComponentLink1Description: Datasheet; ComponentLink1URL: https://wmsc.lcsc.com/wmsc/upload/file/pdf/v2/lcsc/2304140030_Kyocera-AVX-12065C103KAT2A_C2167162.pdf; ComponentLink2Description: JLCPCB Part URL; ComponentLink2URL: https://jlcpcb.com/partdetail/C2167162; ComponentLink3Description: LCSC Part URL; ComponentLink3URL: https://lcsc.com/product-detail/Multilayer-Ceramic-Capacitors-MLCC---SMD-SMT_Kyocera-AVX-Kyocera-AVX-12065C103KAT2A_C2167162.html
footprint CAP-1206 (1206 (3216M) Capacitor)
pins: 1, 2

## 12065C104JAT2A
designator C?  Capacitance: 100nF  (hidden comment: *)
Capacitor, Ceramic (MLCC), 100nF, ±5%, 50V, X7R, ±5%, SMD 1206; Manufacturer: AVX; Manufacturer Part Number: 12065C104JAT2A; Package Size: 1206; JLCPCB Basic Part: No; JLCPCB Part Number: C2972033; Supplier 1: LCSC; Category: Capacitors - MLCC; Supplier Part Number 1: C2972033; Tolerance: ±5%; Voltage Rating: 50V; Temperature Coefficient: X7R; RoHS: Yes; ComponentLink1Description: Datasheet; ComponentLink1URL: https://wmsc.lcsc.com/wmsc/upload/file/pdf/v2/lcsc/2202161030_Kyocera-AVX-12065C104JAT2A_C2972033.pdf; ComponentLink2Description: JLCPCB Part URL; ComponentLink2URL: https://jlcpcb.com/partdetail/C2972033; ComponentLink3Description: LCSC Part URL; ComponentLink3URL: https://lcsc.com/product-detail/Multilayer-Ceramic-Capacitors-MLCC---SMD-SMT_Kyocera-AVX-Kyocera-AVX-12065C104JAT2A_C2972033.html
footprint CAP-1206 (1206 (3216M) Capacitor)
pins: 1, 2

## 12065C104KAZ2A
designator C?  Capacitance: 100nF  (hidden comment: *)
Capacitor, Ceramic (MLCC), 100nF, ±10%, 50V, X7R, ±10%, SMD 1206; Manufacturer: AVX; Manufacturer Part Number: 12065C104KAZ2A; Package Size: 1206; JLCPCB Basic Part: No; JLCPCB Part Number: C597501; Supplier 1: LCSC; Category: Capacitors - MLCC; Supplier Part Number 1: C597501; Tolerance: ±10%; Voltage Rating: 50V; Temperature Coefficient: X7R; RoHS: Yes; ComponentLink1Description: Datasheet; ComponentLink1URL: https://wmsc.lcsc.com/wmsc/upload/file/pdf/v2/lcsc/2304140030_Kyocera-AVX-12065C104KAZ2A_C597501.pdf; ComponentLink2Description: JLCPCB Part URL; ComponentLink2URL: https://jlcpcb.com/partdetail/C597501; ComponentLink3Description: LCSC Part URL; ComponentLink3URL: https://lcsc.com/product-detail/Multilayer-Ceramic-Capacitors-MLCC---SMD-SMT_Kyocera-AVX-Kyocera-AVX-12065C104KAZ2A_C597501.html
footprint CAP-1206 (1206 (3216M) Capacitor)
pins: 1, 2

## 12065C105JAT2A
designator C?  Capacitance: 1uF  (hidden comment: *)
Capacitor, Ceramic (MLCC), 1uF, ±5%, 50V, X7R, ±5%, SMD 1206; Manufacturer: AVX; Manufacturer Part Number: 12065C105JAT2A; Package Size: 1206; JLCPCB Basic Part: No; JLCPCB Part Number: C597503; Supplier 1: LCSC; Category: Capacitors - MLCC; Supplier Part Number 1: C597503; Tolerance: ±5%; Voltage Rating: 50V; Temperature Coefficient: X7R; RoHS: Yes; ComponentLink1Description: Datasheet; ComponentLink1URL: https://wmsc.lcsc.com/wmsc/upload/file/pdf/v2/lcsc/2304140030_Kyocera-AVX-12065C105JAT2A_C597503.pdf; ComponentLink2Description: JLCPCB Part URL; ComponentLink2URL: https://jlcpcb.com/partdetail/C597503; ComponentLink3Description: LCSC Part URL; ComponentLink3URL: https://lcsc.com/product-detail/Multilayer-Ceramic-Capacitors-MLCC---SMD-SMT_Kyocera-AVX-Kyocera-AVX-12065C105JAT2A_C597503.html
footprint CAP-1206 (1206 (3216M) Capacitor)
pins: 1, 2

## 12065C105K4Z2A
designator C?  Capacitance: 1uF  (hidden comment: *)
Capacitor, Ceramic (MLCC), 1uF, ±10%, 50V, X7R, ±10%, SMD 1206; Manufacturer: AVX; Manufacturer Part Number: 12065C105K4Z2A; Package Size: 1206; JLCPCB Basic Part: No; JLCPCB Part Number: C597504; Supplier 1: LCSC; Category: Capacitors - MLCC; Supplier Part Number 1: C597504; Tolerance: ±10%; Voltage Rating: 50V; Temperature Coefficient: X7R; RoHS: Yes; ComponentLink1Description: Datasheet; ComponentLink1URL: https://wmsc.lcsc.com/wmsc/upload/file/pdf/v2/lcsc/2304140030_Kyocera-AVX-12065C105K4Z2A_C597504.pdf; ComponentLink2Description: JLCPCB Part URL; ComponentLink2URL: https://jlcpcb.com/partdetail/C597504; ComponentLink3Description: LCSC Part URL; ComponentLink3URL: https://lcsc.com/product-detail/Multilayer-Ceramic-Capacitors-MLCC---SMD-SMT_Kyocera-AVX-Kyocera-AVX-12065C105K4Z2A_C597504.html
footprint CAP-1206 (1206 (3216M) Capacitor)
pins: 1, 2

## 12065C105KAT2A
designator C?  Capacitance: 1uF  (hidden comment: *)
Capacitor, Ceramic (MLCC), 1uF, ±10%, 50V, X7R, ±10%, SMD 1206; Manufacturer: AVX; Manufacturer Part Number: 12065C105KAT2A; Package Size: 1206; JLCPCB Basic Part: No; JLCPCB Part Number: C597505; Supplier 1: LCSC; Category: Capacitors - MLCC; Supplier Part Number 1: C597505; Tolerance: ±10%; Voltage Rating: 50V; Temperature Coefficient: X7R; RoHS: Yes; ComponentLink1Description: Datasheet; ComponentLink1URL: https://wmsc.lcsc.com/wmsc/upload/file/pdf/v2/lcsc/2304140030_Kyocera-AVX-12065C105KAT2A_C597505.pdf; ComponentLink2Description: JLCPCB Part URL; ComponentLink2URL: https://jlcpcb.com/partdetail/C597505; ComponentLink3Description: LCSC Part URL; ComponentLink3URL: https://lcsc.com/product-detail/Multilayer-Ceramic-Capacitors-MLCC---SMD-SMT_Kyocera-AVX-Kyocera-AVX-12065C105KAT2A_C597505.html
footprint CAP-1206 (1206 (3216M) Capacitor)
pins: 1, 2

## 12065C123JAT2A
designator C?  Capacitance: 12nF  (hidden comment: *)
Capacitor, Ceramic (MLCC), 12nF, ±5%, 50V, X7R, ±5%, SMD 1206; Manufacturer: AVX; Manufacturer Part Number: 12065C123JAT2A; Package Size: 1206; JLCPCB Basic Part: No; JLCPCB Part Number: C382089; Supplier 1: LCSC; Category: Capacitors - MLCC; Supplier Part Number 1: C382089; Tolerance: ±5%; Voltage Rating: 50V; Temperature Coefficient: X7R; RoHS: Yes; ComponentLink1Description: Datasheet; ComponentLink1URL: https://wmsc.lcsc.com/wmsc/upload/file/pdf/v2/lcsc/2304140030_Kyocera-AVX-12065C123JAT2A_C382089.pdf; ComponentLink2Description: JLCPCB Part URL; ComponentLink2URL: https://jlcpcb.com/partdetail/C382089; ComponentLink3Description: LCSC Part URL; ComponentLink3URL: https://lcsc.com/product-detail/Multilayer-Ceramic-Capacitors-MLCC---SMD-SMT_Kyocera-AVX-Kyocera-AVX-12065C123JAT2A_C382089.html
footprint CAP-1206 (1206 (3216M) Capacitor)
pins: 1, 2

## 12065C225K4T2A
designator C?  Capacitance: 2.2uF  (hidden comment: *)
Capacitor, Ceramic (MLCC), 2.2uF, ±10%, 50V, X7R, ±10%, SMD 1206; Manufacturer: Kyocera AVX; Manufacturer Part Number: 12065C225K4T2A; Package Size: 1206; JLCPCB Basic Part: No; JLCPCB Part Number: C2172638; Supplier 1: LCSC; Category: Capacitors - MLCC; Supplier Part Number 1: C2172638; Tolerance: ±10%; Voltage Rating: 50V; Temperature Coefficient: X7R; RoHS: Yes; ComponentLink1Description: Datasheet; ComponentLink1URL: https://wmsc.lcsc.com/wmsc/upload/file/pdf/v2/lcsc/2304140030_Kyocera-AVX-12065C225K4T2A_C2172638.pdf; ComponentLink2Description: JLCPCB Part URL; ComponentLink2URL: https://jlcpcb.com/partdetail/C2172638; ComponentLink3Description: LCSC Part URL; ComponentLink3URL: https://lcsc.com/product-detail/Multilayer-Ceramic-Capacitors-MLCC---SMD-SMT_Kyocera-AVX-Kyocera-AVX-12065C225K4T2A_C2172638.html
footprint CAP-1206 (1206 (3216M) Capacitor)
pins: 1, 2

## 12065C225K4Z2A
designator C?  Capacitance: 2.2uF  (hidden comment: *)
Capacitor, Ceramic (MLCC), 2.2uF, ±10%, 50V, X7R, ±10%, SMD 1206; Manufacturer: AVX; Manufacturer Part Number: 12065C225K4Z2A; Package Size: 1206; JLCPCB Basic Part: No; JLCPCB Part Number: C597513; Supplier 1: LCSC; Category: Capacitors - MLCC; Supplier Part Number 1: C597513; Tolerance: ±10%; Voltage Rating: 50V; Temperature Coefficient: X7R; RoHS: Yes; ComponentLink1Description: Datasheet; ComponentLink1URL: https://wmsc.lcsc.com/wmsc/upload/file/pdf/v2/lcsc/2304140030_Kyocera-AVX-12065C225K4Z2A_C597513.pdf; ComponentLink2Description: JLCPCB Part URL; ComponentLink2URL: https://jlcpcb.com/partdetail/C597513; ComponentLink3Description: LCSC Part URL; ComponentLink3URL: https://lcsc.com/product-detail/Multilayer-Ceramic-Capacitors-MLCC---SMD-SMT_Kyocera-AVX-Kyocera-AVX-12065C225K4Z2A_C597513.html
footprint CAP-1206 (1206 (3216M) Capacitor)
pins: 1, 2

## 12065C474JAT2A
designator C?  Capacitance: 470nF  (hidden comment: *)
Capacitor, Ceramic (MLCC), 470nF, ±5%, 50V, X7R, ±5%, SMD 1206; Manufacturer: Kyocera AVX; Manufacturer Part Number: 12065C474JAT2A; Package Size: 1206; JLCPCB Basic Part: No; JLCPCB Part Number: C2167429; Supplier 1: LCSC; Category: Capacitors - MLCC; Supplier Part Number 1: C2167429; Tolerance: ±5%; Voltage Rating: 50V; Temperature Coefficient: X7R; RoHS: Yes; ComponentLink1Description: Datasheet; ComponentLink1URL: https://wmsc.lcsc.com/wmsc/upload/file/pdf/v2/lcsc/2304140030_Kyocera-AVX-12065C474JAT2A_C2167429.pdf; ComponentLink2Description: JLCPCB Part URL; ComponentLink2URL: https://jlcpcb.com/partdetail/C2167429; ComponentLink3Description: LCSC Part URL; ComponentLink3URL: https://lcsc.com/product-detail/Multilayer-Ceramic-Capacitors-MLCC---SMD-SMT_Kyocera-AVX-Kyocera-AVX-12065C474JAT2A_C2167429.html
footprint CAP-1206 (1206 (3216M) Capacitor)
pins: 1, 2

## 12065C475K4T2A
designator C?  Capacitance: 4.7uF  (hidden comment: *)
Capacitor, Ceramic (MLCC), 4.7uF, ±10%, 50V, X7R, ±10%, SMD 1206; Manufacturer: AVX; Manufacturer Part Number: 12065C475K4T2A; Package Size: 1206; JLCPCB Basic Part: No; JLCPCB Part Number: C597525; Supplier 1: LCSC; Category: Capacitors - MLCC; Supplier Part Number 1: C597525; Tolerance: ±10%; Voltage Rating: 50V; Temperature Coefficient: X7R; RoHS: Yes; ComponentLink1Description: Datasheet; ComponentLink1URL: https://wmsc.lcsc.com/wmsc/upload/file/pdf/v2/lcsc/2304140030_Kyocera-AVX-12065C475K4T2A_C597525.pdf; ComponentLink2Description: JLCPCB Part URL; ComponentLink2URL: https://jlcpcb.com/partdetail/C597525; ComponentLink3Description: LCSC Part URL; ComponentLink3URL: https://lcsc.com/product-detail/Multilayer-Ceramic-Capacitors-MLCC---SMD-SMT_Kyocera-AVX-Kyocera-AVX-12065C475K4T2A_C597525.html
footprint CAP-1206 (1206 (3216M) Capacitor)
pins: 1, 2

## 12065C475K4Z2A
designator C?  Capacitance: 4.7uF  (hidden comment: *)
Capacitor, Ceramic (MLCC), 4.7uF, ±10%, 50V, X7R, ±10%, SMD 1206; Manufacturer: Kyocera AVX; Manufacturer Part Number: 12065C475K4Z2A; Package Size: 1206; JLCPCB Basic Part: No; JLCPCB Part Number: C779997; Supplier 1: LCSC; Category: Capacitors - MLCC; Supplier Part Number 1: C779997; Tolerance: ±10%; Voltage Rating: 50V; Temperature Coefficient: X7R; RoHS: Yes; ComponentLink1Description: Datasheet; ComponentLink1URL: https://wmsc.lcsc.com/wmsc/upload/file/pdf/v2/lcsc/2304140030_Kyocera-AVX-12065C475K4Z2A_C779997.pdf; ComponentLink2Description: JLCPCB Part URL; ComponentLink2URL: https://jlcpcb.com/partdetail/C779997; ComponentLink3Description: LCSC Part URL; ComponentLink3URL: https://lcsc.com/product-detail/Multilayer-Ceramic-Capacitors-MLCC---SMD-SMT_Kyocera-AVX-Kyocera-AVX-12065C475K4Z2A_C779997.html
footprint CAP-1206 (1206 (3216M) Capacitor)
pins: 1, 2
